# Altium footprint library PCB_ConnectorHDR.PcbLib: 221 footprints (part 13 of 14)
Each footprint in its own frame and in the unit in brackets; x right, y up, seen from the top. Pads: shape width x height; smd on the part's side, far side on the other; paste and mask are expansions set on the pad; w line width, h text height; cw(c..) or ccw(c..) is an arc to the next point about the centre after c.
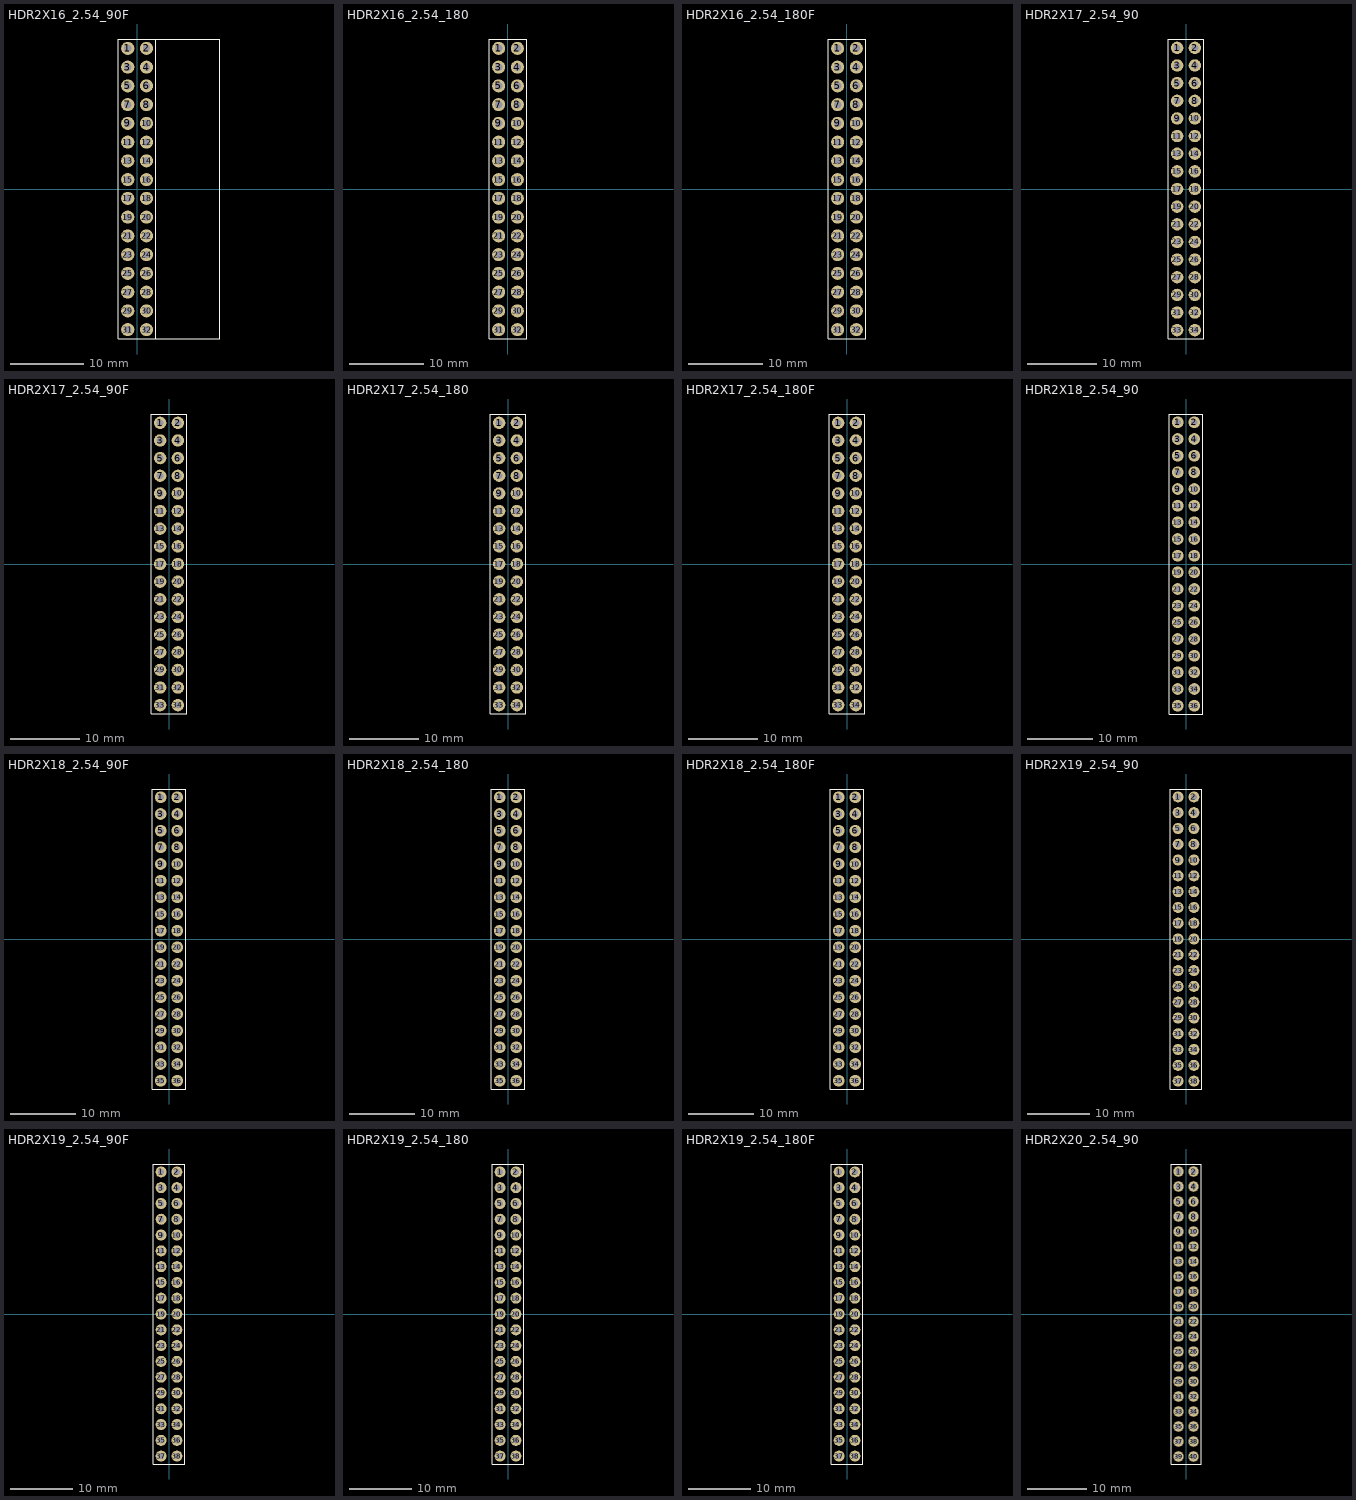
[diagram p12: the footprints below, top view; thin cyan lines are the x and y axes]

## HDR2X16_2.54_90F [mil]
height 169.29
pads (32):
  round 70 hole 39.37: 1(-50,750) 2(50,750) 3(-50,650) 4(50,650) 5(-50,550) 6(50,550) 7(-50,450) 8(50,450) 9(-50,350) 10(50,350) 11(-50,250) 12(50,250) 13(-50,150) 14(50,150) 15(-50,50) 16(50,50) 17(-50,-50) 18(50,-50) 19(-50,-150) 20(50,-150) 21(-50,-250) 22(50,-250) 23(-50,-350) 24(50,-350) 25(-50,-450) 26(50,-450) 27(-50,-550) 28(50,-550) 29(-50,-650) 30(50,-650) 31(-50,-750) 32(50,-750)
Top Overlay:
  lines w2: -100,-800 440,-800 440,800 -100,800 ; -100,-800 -100,800 ; -100,-800 100,-800 100,800 -100,800 ; -100,-800 -100,800
3D body "female_header_A-BL254-DA-G32D.stp": height 197.35, standoff -125.48, extent -56,-804.84 440.06,805

## HDR2X16_2.54_180 [mil]
height 169.29
pads (32):
  round 70 hole 39.37: 1(-50,750) 2(50,750) 3(-50,650) 4(50,650) 5(-50,550) 6(50,550) 7(-50,450) 8(50,450) 9(-50,350) 10(50,350) 11(-50,250) 12(50,250) 13(-50,150) 14(50,150) 15(-50,50) 16(50,50) 17(-50,-50) 18(50,-50) 19(-50,-150) 20(50,-150) 21(-50,-250) 22(50,-250) 23(-50,-350) 24(50,-350) 25(-50,-450) 26(50,-450) 27(-50,-550) 28(50,-550) 29(-50,-650) 30(50,-650) 31(-50,-750) 32(50,-750)
Top Overlay:
  lines w2: -100,-800 -100,800 ; -100,-800 100,-800 ; -100,-800 -100,800 ; -100,-800 100,-800 ; -100,800 100,800 ; -100,800 100,800 ; 100,-800 100,800 ; 100,-800 100,800
3D body "pin_header_awl254-dg-g32d.stp": height 334.65, standoff -118.11, extent -100,-800 100,800

## HDR2X16_2.54_180F [mil]
height 169.29
pads (32):
  round 70 hole 39.37: 1(-50,750) 2(50,750) 3(-50,650) 4(50,650) 5(-50,550) 6(50,550) 7(-50,450) 8(50,450) 9(-50,350) 10(50,350) 11(-50,250) 12(50,250) 13(-50,150) 14(50,150) 15(-50,50) 16(50,50) 17(-50,-50) 18(50,-50) 19(-50,-150) 20(50,-150) 21(-50,-250) 22(50,-250) 23(-50,-350) 24(50,-350) 25(-50,-450) 26(50,-450) 27(-50,-550) 28(50,-550) 29(-50,-650) 30(50,-650) 31(-50,-750) 32(50,-750)
Top Overlay:
  lines w2: -100,-800 -100,800 ; -100,-800 100,-800 ; -100,-800 -100,800 ; -100,-800 100,-800 ; -100,800 100,800 ; -100,800 100,800 ; 100,-800 100,800 ; 100,-800 100,800
3D body "female_header_a-bl254-dg-g32d.stp": height 334.65, standoff -125.98, extent -98.43,-804.84 98.43,805

## HDR2X17_2.54_90 [mil]
height 169.29
pads (34):
  round 70 hole 39.37: 1(-50,800) 2(50,800) 3(-50,700) 4(50,700) 5(-50,600) 6(50,600) 7(-50,500) 8(50,500) 9(-50,400) 10(50,400) 11(-50,300) 12(50,300) 13(-50,200) 14(50,200) 15(-50,100) 16(50,100) 17(-50,0) 18(50,0) 19(-50,-100) 20(50,-100) 21(-50,-200) 22(50,-200) 23(-50,-300) 24(50,-300) 25(-50,-400) 26(50,-400) 27(-50,-500) 28(50,-500) 29(-50,-600) 30(50,-600) 31(-50,-700) 32(50,-700) 33(-50,-800) 34(50,-800)
Top Overlay:
  lines w2: -100,-850 100,-850 ; -100,-850 -100,850 ; -100,-850 100,-850 ; -100,-850 -100,850 ; -100,850 100,850 ; -100,850 100,850 ; 100,-850 100,850 ; 100,-850 100,850
3D body "pin_header_awl254-da-g34d.stp": height 197.35, standoff -117.61, extent -63,-850 444.09,850

## HDR2X17_2.54_90F [mil]
height 169.29
pads (34):
  round 70 hole 39.37: 1(-50,800) 2(50,800) 3(-50,700) 4(50,700) 5(-50,600) 6(50,600) 7(-50,500) 8(50,500) 9(-50,400) 10(50,400) 11(-50,300) 12(50,300) 13(-50,200) 14(50,200) 15(-50,100) 16(50,100) 17(-50,0) 18(50,0) 19(-50,-100) 20(50,-100) 21(-50,-200) 22(50,-200) 23(-50,-300) 24(50,-300) 25(-50,-400) 26(50,-400) 27(-50,-500) 28(50,-500) 29(-50,-600) 30(50,-600) 31(-50,-700) 32(50,-700) 33(-50,-800) 34(50,-800)
Top Overlay:
  lines w2: -100,-850 100,-850 ; -100,-850 -100,850 ; -100,-850 100,-850 ; -100,-850 -100,850 ; -100,850 100,850 ; -100,850 100,850 ; 100,-850 100,850 ; 100,-850 100,850
3D body "female_header_A-BL254-DA-G34D.stp": height 197.35, standoff -125.48, extent -60,-854.84 436.06,855

## HDR2X17_2.54_180 [mil]
height 169.29
pads (34):
  round 70 hole 39.37: 1(-50,800) 2(50,800) 3(-50,700) 4(50,700) 5(-50,600) 6(50,600) 7(-50,500) 8(50,500) 9(-50,400) 10(50,400) 11(-50,300) 12(50,300) 13(-50,200) 14(50,200) 15(-50,100) 16(50,100) 17(-50,0) 18(50,0) 19(-50,-100) 20(50,-100) 21(-50,-200) 22(50,-200) 23(-50,-300) 24(50,-300) 25(-50,-400) 26(50,-400) 27(-50,-500) 28(50,-500) 29(-50,-600) 30(50,-600) 31(-50,-700) 32(50,-700) 33(-50,-800) 34(50,-800)
Top Overlay:
  lines w2: -100,-850 100,-850 ; -100,-850 -100,850 ; -100,-850 100,-850 ; -100,-850 -100,850 ; -100,850 100,850 ; -100,850 100,850 ; 100,-850 100,850 ; 100,-850 100,850
3D body "User Library-PLD-34.step": height 330.71, standoff -118.11, extent -98,-850 98.85,850

## HDR2X17_2.54_180F [mil]
height 169.29
pads (34):
  round 70 hole 39.37: 1(-50,800) 2(50,800) 3(-50,700) 4(50,700) 5(-50,600) 6(50,600) 7(-50,500) 8(50,500) 9(-50,400) 10(50,400) 11(-50,300) 12(50,300) 13(-50,200) 14(50,200) 15(-50,100) 16(50,100) 17(-50,0) 18(50,0) 19(-50,-100) 20(50,-100) 21(-50,-200) 22(50,-200) 23(-50,-300) 24(50,-300) 25(-50,-400) 26(50,-400) 27(-50,-500) 28(50,-500) 29(-50,-600) 30(50,-600) 31(-50,-700) 32(50,-700) 33(-50,-800) 34(50,-800)
Top Overlay:
  lines w2: -100,-850 -100,850 ; -100,-850 100,-850 ; -100,-850 -100,850 ; -100,-850 100,-850 ; -100,850 100,850 ; -100,850 100,850 ; 100,-850 100,850 ; 100,-850 100,850
3D body "female_header_a-bl254-dg-g34d.stp": height 334.65, standoff -125.98, extent -98,-854.84 98.85,855

## HDR2X18_2.54_90 [mil]
height 169.29
pads (36):
  round 70 hole 39.37: 1(-50,850) 2(50,850) 3(-50,750) 4(50,750) 5(-50,650) 6(50,650) 7(-50,550) 8(50,550) 9(-50,450) 10(50,450) 11(-50,350) 12(50,350) 13(-50,250) 14(50,250) 15(-50,150) 16(50,150) 17(-50,50) 18(50,50) 19(-50,-50) 20(50,-50) 21(-50,-150) 22(50,-150) 23(-50,-250) 24(50,-250) 25(-50,-350) 26(50,-350) 27(-50,-450) 28(50,-450) 29(-50,-550) 30(50,-550) 31(-50,-650) 32(50,-650) 33(-50,-750) 34(50,-750) 35(-50,-850) 36(50,-850)
Top Overlay:
  lines w2: -100,-900 -100,900 ; -100,-900 -100,900 ; -100,-900 100,-900 ; -100,900 100,900 ; -100,900 100,900 ; 100,-900 100,900 ; 100,-900 100,900
3D body "pin_header_awl254-da-g36d.stp": height 197.35, standoff -117.61, extent -63,-900 444.09,900

## HDR2X18_2.54_90F [mil]
height 169.29
pads (36):
  round 70 hole 39.37: 1(-50,850) 2(50,850) 3(-50,750) 4(50,750) 5(-50,650) 6(50,650) 7(-50,550) 8(50,550) 9(-50,450) 10(50,450) 11(-50,350) 12(50,350) 13(-50,250) 14(50,250) 15(-50,150) 16(50,150) 17(-50,50) 18(50,50) 19(-50,-50) 20(50,-50) 21(-50,-150) 22(50,-150) 23(-50,-250) 24(50,-250) 25(-50,-350) 26(50,-350) 27(-50,-450) 28(50,-450) 29(-50,-550) 30(50,-550) 31(-50,-650) 32(50,-650) 33(-50,-750) 34(50,-750) 35(-50,-850) 36(50,-850)
Top Overlay:
  lines w2: -100,-900 100,-900 ; -100,-900 -100,900 ; -100,-900 -100,900 ; -100,900 100,900 ; -100,900 100,900 ; 100,-900 100,900 ; 100,-900 100,900
3D body "female_header_A-BL254-DA-G36D.stp": height 197.35, standoff -125.48, extent -60,-904.84 436.06,905

## HDR2X18_2.54_180 [mil]
height 169.29
pads (36):
  round 70 hole 39.37: 1(-50,850) 2(50,850) 3(-50,750) 4(50,750) 5(-50,650) 6(50,650) 7(-50,550) 8(50,550) 9(-50,450) 10(50,450) 11(-50,350) 12(50,350) 13(-50,250) 14(50,250) 15(-50,150) 16(50,150) 17(-50,50) 18(50,50) 19(-50,-50) 20(50,-50) 21(-50,-150) 22(50,-150) 23(-50,-250) 24(50,-250) 25(-50,-350) 26(50,-350) 27(-50,-450) 28(50,-450) 29(-50,-550) 30(50,-550) 31(-50,-650) 32(50,-650) 33(-50,-750) 34(50,-750) 35(-50,-850) 36(50,-850)
Top Overlay:
  lines w2: -100,-900 100,-900 ; -100,-900 -100,900 ; -100,-900 -100,900 ; -100,900 100,900 ; -100,900 100,900 ; 100,-900 100,900 ; 100,-900 100,900
3D body "User Library-PLD-36.step": height 330.71, standoff -118.11, extent -98,-900 98.85,900

## HDR2X18_2.54_180F [mil]
height 169.29
pads (36):
  round 70 hole 39.37: 1(-50,850) 2(50,850) 3(-50,750) 4(50,750) 5(-50,650) 6(50,650) 7(-50,550) 8(50,550) 9(-50,450) 10(50,450) 11(-50,350) 12(50,350) 13(-50,250) 14(50,250) 15(-50,150) 16(50,150) 17(-50,50) 18(50,50) 19(-50,-50) 20(50,-50) 21(-50,-150) 22(50,-150) 23(-50,-250) 24(50,-250) 25(-50,-350) 26(50,-350) 27(-50,-450) 28(50,-450) 29(-50,-550) 30(50,-550) 31(-50,-650) 32(50,-650) 33(-50,-750) 34(50,-750) 35(-50,-850) 36(50,-850)
Top Overlay:
  lines w2: -100,-900 100,-900 ; -100,-900 -100,900 ; -100,-900 -100,900 ; -100,900 100,900 ; -100,900 100,900 ; 100,-900 100,900 ; 100,-900 100,900
3D body "female_header_a-bl254-dg-g36d.stp": height 334.65, standoff -125.98, extent -98,-904.84 98.85,905

## HDR2X19_2.54_90 [mil]
height 169.29
pads (38):
  round 70 hole 39.37: 1(-50,900) 2(50,900) 3(-50,800) 4(50,800) 5(-50,700) 6(50,700) 7(-50,600) 8(50,600) 9(-50,500) 10(50,500) 11(-50,400) 12(50,400) 13(-50,300) 14(50,300) 15(-50,200) 16(50,200) 17(-50,100) 18(50,100) 19(-50,0) 20(50,0) 21(-50,-100) 22(50,-100) 23(-50,-200) 24(50,-200) 25(-50,-300) 26(50,-300) 27(-50,-400) 28(50,-400) 29(-50,-500) 30(50,-500) 31(-50,-600) 32(50,-600) 33(-50,-700) 34(50,-700) 35(-50,-800) 36(50,-800) 37(-50,-900) 38(50,-900)
Top Overlay:
  lines w2: -100,-950 -100,950 ; -100,-950 100,-950 ; -100,-950 -100,950 ; -100,-950 100,-950 ; -100,950 100,950 ; -100,950 100,950 ; 100,-950 100,950 ; 100,-950 100,950
3D body "pin_header_awl254-da-g38d.stp": height 197.35, standoff -117.61, extent -63,-950 444.09,950

## HDR2X19_2.54_90F [mil]
height 169.29
pads (38):
  round 70 hole 39.37: 1(-50,900) 2(50,900) 3(-50,800) 4(50,800) 5(-50,700) 6(50,700) 7(-50,600) 8(50,600) 9(-50,500) 10(50,500) 11(-50,400) 12(50,400) 13(-50,300) 14(50,300) 15(-50,200) 16(50,200) 17(-50,100) 18(50,100) 19(-50,0) 20(50,0) 21(-50,-100) 22(50,-100) 23(-50,-200) 24(50,-200) 25(-50,-300) 26(50,-300) 27(-50,-400) 28(50,-400) 29(-50,-500) 30(50,-500) 31(-50,-600) 32(50,-600) 33(-50,-700) 34(50,-700) 35(-50,-800) 36(50,-800) 37(-50,-900) 38(50,-900)
Top Overlay:
  lines w2: -100,-950 -100,950 ; -100,-950 100,-950 ; -100,-950 -100,950 ; -100,-950 100,-950 ; -100,950 100,950 ; -100,950 100,950 ; 100,-950 100,950 ; 100,-950 100,950
3D body "female_header_a-bl254-da-g38d.stp": height 197.35, standoff -125.48, extent -60,-954.84 436.06,955

## HDR2X19_2.54_180 [mil]
height 169.29
pads (38):
  round 70 hole 39.37: 1(-50,900) 2(50,900) 3(-50,800) 4(50,800) 5(-50,700) 6(50,700) 7(-50,600) 8(50,600) 9(-50,500) 10(50,500) 11(-50,400) 12(50,400) 13(-50,300) 14(50,300) 15(-50,200) 16(50,200) 17(-50,100) 18(50,100) 19(-50,0) 20(50,0) 21(-50,-100) 22(50,-100) 23(-50,-200) 24(50,-200) 25(-50,-300) 26(50,-300) 27(-50,-400) 28(50,-400) 29(-50,-500) 30(50,-500) 31(-50,-600) 32(50,-600) 33(-50,-700) 34(50,-700) 35(-50,-800) 36(50,-800) 37(-50,-900) 38(50,-900)
Top Overlay:
  lines w2: -100,-950 -100,950 ; -100,-950 100,-950 ; -100,-950 -100,950 ; -100,-950 100,-950 ; -100,950 100,950 ; -100,950 100,950 ; 100,-950 100,950 ; 100,-950 100,950
3D body "User Library-PLD-38.step": height 330.71, standoff -118.11, extent -98.42,-950 98.43,950

## HDR2X19_2.54_180F [mil]
height 169.29
pads (38):
  round 70 hole 39.37: 1(-50,900) 2(50,900) 3(-50,800) 4(50,800) 5(-50,700) 6(50,700) 7(-50,600) 8(50,600) 9(-50,500) 10(50,500) 11(-50,400) 12(50,400) 13(-50,300) 14(50,300) 15(-50,200) 16(50,200) 17(-50,100) 18(50,100) 19(-50,0) 20(50,0) 21(-50,-100) 22(50,-100) 23(-50,-200) 24(50,-200) 25(-50,-300) 26(50,-300) 27(-50,-400) 28(50,-400) 29(-50,-500) 30(50,-500) 31(-50,-600) 32(50,-600) 33(-50,-700) 34(50,-700) 35(-50,-800) 36(50,-800) 37(-50,-900) 38(50,-900)
Top Overlay:
  lines w2: -100,-950 -100,950 ; -100,-950 100,-950 ; -100,-950 -100,950 ; -100,-950 100,-950 ; -100,950 100,950 ; -100,950 100,950 ; 100,-950 100,950 ; 100,-950 100,950
3D body "female_header_a-bl254-dg-g38d.stp": height 334.65, standoff -125.98, extent -98,-954.84 98.85,955

## HDR2X20_2.54_90 [mil]
height 169.29
pads (40):
  round 70 hole 39.37: 1(-50,950) 2(50,950) 3(-50,850) 4(50,850) 5(-50,750) 6(50,750) 7(-50,650) 8(50,650) 9(-50,550) 10(50,550) 11(-50,450) 12(50,450) 13(-50,350) 14(50,350) 15(-50,250) 16(50,250) 17(-50,150) 18(50,150) 19(-50,50) 20(50,50) 21(-50,-50) 22(50,-50) 23(-50,-150) 24(50,-150) 25(-50,-250) 26(50,-250) 27(-50,-350) 28(50,-350) 29(-50,-450) 30(50,-450) 31(-50,-550) 32(50,-550) 33(-50,-650) 34(50,-650) 35(-50,-750) 36(50,-750) 37(-50,-850) 38(50,-850) 39(-50,-950) 40(50,-950)
Top Overlay:
  lines w2: -100,-1000 -100,1000 ; -100,-1000 100,-1000 ; -100,-1000 -100,1000 ; -100,-1000 100,-1000 ; -100,1000 100,1000 ; -100,1000 100,1000 ; 100,-1000 100,1000 ; 100,-1000 100,1000
3D body "pin_header_awl254-da-g40d.stp": height 197.35, standoff -117.61, extent -63,-1000 444.09,1000